# Altium footprint library GyokuRe.PcbLib: 1248 footprints (part 56 of 78) (continued)
## QFP208-28X28 [mm]
pads (210):
  oval 1.55x0.3 smd: 1(-14.899,12.751)
  rect 1.55x0.3 smd: 2(-14.899,12.251) 3(-14.899,11.751) 4(-14.899,11.251) 5(-14.899,10.751) 6(-14.899,10.251) 7(-14.899,9.751) 8(-14.899,9.251) 9(-14.899,8.751) 10(-14.899,8.251) 11(-14.899,7.751) 12(-14.899,7.251) 13(-14.899,6.751) 14(-14.899,6.251) 15(-14.899,5.751) 16(-14.899,5.251) 17(-14.899,4.751) 18(-14.899,4.251) 19(-14.899,3.751) 20(-14.899,3.251) 21(-14.899,2.751) 22(-14.899,2.251) 23(-14.899,1.751) 24(-14.899,1.251) 25(-14.899,0.751) 26(-14.899,0.251) 27(-14.899,-0.249) 28(-14.899,-0.749) 29(-14.899,-1.249) 30(-14.899,-1.749) 31(-14.899,-2.249) 32(-14.899,-2.749) 33(-14.899,-3.249) 34(-14.899,-3.749) 35(-14.899,-4.249) 36(-14.899,-4.749) 37(-14.899,-5.249) 38(-14.899,-5.749) 39(-14.899,-6.249) 40(-14.899,-6.749) 41(-14.899,-7.249) 42(-14.899,-7.749) 43(-14.899,-8.249) 44(-14.899,-8.749) 45(-14.899,-9.249) 46(-14.899,-9.749) 47(-14.899,-10.249) 48(-14.899,-10.749) 49(-14.899,-11.249) 50(-14.899,-11.749) 51(-14.899,-12.249) 52(-14.899,-12.749) 105(14.901,-12.749) 106(14.901,-12.249) 107(14.901,-11.749) 108(14.901,-11.249) 109(14.901,-10.749) 110(14.901,-10.249) 111(14.901,-9.749) 112(14.901,-9.249) 113(14.901,-8.749) 114(14.901,-8.249) 115(14.901,-7.749) 116(14.901,-7.249) 117(14.901,-6.749) 118(14.901,-6.249) 119(14.901,-5.749) 120(14.901,-5.249) 121(14.901,-4.749) 122(14.901,-4.249) 123(14.901,-3.749) 124(14.901,-3.249) 125(14.901,-2.749) 126(14.901,-2.249) 127(14.901,-1.749) 128(14.901,-1.249) 129(14.901,-0.749) 130(14.901,-0.249) 131(14.901,0.251) 132(14.901,0.751) 133(14.901,1.251) 134(14.901,1.751) 135(14.901,2.251) 136(14.901,2.751) 137(14.901,3.251) 138(14.901,3.751) 139(14.901,4.251) 140(14.901,4.751) 141(14.901,5.251) 142(14.901,5.751) 143(14.901,6.251) 144(14.901,6.751) 145(14.901,7.251) 146(14.901,7.751) 147(14.901,8.251) 148(14.901,8.751) 149(14.901,9.251) 150(14.901,9.751) 151(14.901,10.251) 152(14.901,10.751) 153(14.901,11.251) 154(14.901,11.751) 155(14.901,12.251) 156(14.901,12.751)
  rect 0.3x1.55 smd: 53(-12.749,-14.899) 54(-12.249,-14.899) 55(-11.749,-14.899) 56(-11.249,-14.899) 57(-10.749,-14.899) 58(-10.249,-14.899) 59(-9.749,-14.899) 60(-9.249,-14.899) 61(-8.749,-14.899) 62(-8.249,-14.899) 63(-7.749,-14.899) 64(-7.249,-14.899) 65(-6.749,-14.899) 66(-6.249,-14.899) 67(-5.749,-14.899) 68(-5.249,-14.899) 69(-4.749,-14.899) 70(-4.249,-14.899) 71(-3.749,-14.899) 72(-3.249,-14.899) 73(-2.749,-14.899) 74(-2.249,-14.899) 75(-1.749,-14.899) 76(-1.249,-14.899) 77(-0.749,-14.899) 78(-0.249,-14.899) 79(0.251,-14.899) 80(0.751,-14.899) 81(1.251,-14.899) 82(1.751,-14.899) 83(2.251,-14.899) 84(2.751,-14.899) 85(3.251,-14.899) 86(3.751,-14.899) 87(4.251,-14.899) 88(4.751,-14.899) 89(5.251,-14.899) 90(5.751,-14.899) 91(6.251,-14.899) 92(6.751,-14.899) 93(7.251,-14.899) 94(7.751,-14.899) 95(8.251,-14.899) 96(8.751,-14.899) 97(9.251,-14.899) 98(9.751,-14.899) 99(10.251,-14.899) 100(10.751,-14.899) 101(11.251,-14.899) 102(11.751,-14.899) 103(12.251,-14.899) 104(12.751,-14.899) 157(12.751,14.901) 158(12.251,14.901) 159(11.751,14.901) 160(11.251,14.901) 161(10.751,14.901) 162(10.251,14.901) 163(9.751,14.901) 164(9.251,14.901) 165(8.751,14.901) 166(8.251,14.901) 167(7.751,14.901) 168(7.251,14.901) 169(6.751,14.901) 170(6.251,14.901) 171(5.751,14.901) 172(5.251,14.901) 173(4.751,14.901) 174(4.251,14.901) 175(3.751,14.901) 176(3.251,14.901) 177(2.751,14.901) 178(2.251,14.901) 179(1.751,14.901) 180(1.251,14.901) 181(0.751,14.901) 182(0.251,14.901) 183(-0.249,14.901) 184(-0.749,14.901) 185(-1.249,14.901) 186(-1.749,14.901) 187(-2.249,14.901) 188(-2.749,14.901) 189(-3.249,14.901) 190(-3.749,14.901) 191(-4.249,14.901) 192(-4.749,14.901) 193(-5.249,14.901) 194(-5.749,14.901) 195(-6.249,14.901) 196(-6.749,14.901) 197(-7.249,14.901) 198(-7.749,14.901) 199(-8.249,14.901) 200(-8.749,14.901) 201(-9.249,14.901) 202(-9.749,14.901) 203(-10.249,14.901) 204(-10.749,14.901) 205(-11.249,14.901) 206(-11.749,14.901) 207(-12.249,14.901) 208(-12.749,14.901)
  round 1 smd: FID1(-14.899,-14.899) FID2(14.901,14.901)
Top Layer keep-out:
  circle w0.2: c14.901,14.901 r1.4
  circle w0.2: c-14.899,-14.899 r1.4
Top Overlay:
  circle w0.25: c-14.899,13.451 r0.125
  lines w0.2: -13.724,-13.724 13.726,-13.724 13.726,13.726 -13.724,13.726 -13.724,-13.724

## QFP240- 32X32 [mm] "240-Pin Plastic Quad Flat Pack (PQFP)"
height 4.1
pads (242):
  rect 1.5x0.3 smd: 1(-16.968,14.744)
  oval 1.5x0.3 smd: 2(-16.968,14.244) 3(-16.968,13.744) 4(-16.968,13.244) 5(-16.968,12.744) 6(-16.968,12.244) 7(-16.968,11.744) 8(-16.968,11.244) 9(-16.968,10.744) 10(-16.968,10.244) 11(-16.968,9.744) 12(-16.968,9.244) 13(-16.968,8.744) 14(-16.968,8.244) 15(-16.968,7.744) 16(-16.968,7.244) 17(-16.968,6.744) 18(-16.968,6.244) 19(-16.968,5.744) 20(-16.968,5.244) 21(-16.968,4.744) 22(-16.968,4.244) 23(-16.968,3.744) 24(-16.968,3.244) 25(-16.968,2.744) 26(-16.968,2.244) 27(-16.968,1.744) 28(-16.968,1.244) 29(-16.968,0.744) 30(-16.968,0.244) 31(-16.968,-0.256) 32(-16.968,-0.756) 33(-16.968,-1.256) 34(-16.968,-1.756) 35(-16.968,-2.256) 36(-16.968,-2.756) 37(-16.968,-3.256) 38(-16.968,-3.756) 39(-16.968,-4.256) 40(-16.968,-4.756) 41(-16.968,-5.256) 42(-16.968,-5.756) 43(-16.968,-6.256) 44(-16.968,-6.756) 45(-16.968,-7.256) 46(-16.968,-7.756) 47(-16.968,-8.256) 48(-16.968,-8.756) 49(-16.968,-9.256) 50(-16.968,-9.756) 51(-16.968,-10.256) 52(-16.968,-10.756) 53(-16.968,-11.256) 54(-16.968,-11.756) 55(-16.968,-12.256) 56(-16.968,-12.756) 57(-16.968,-13.256) 58(-16.968,-13.756) 59(-16.968,-14.256) 60(-16.968,-14.756) 121(16.982,-14.756) 122(16.982,-14.256) 123(16.982,-13.756) 124(16.982,-13.256) 125(16.982,-12.756) 126(16.982,-12.256) 127(16.982,-11.756) 128(16.982,-11.256) 129(16.982,-10.756) 130(16.982,-10.256) 131(16.982,-9.756) 132(16.982,-9.256) 133(16.982,-8.756) 134(16.982,-8.256) 135(16.982,-7.756) 136(16.982,-7.256) 137(16.982,-6.756) 138(16.982,-6.256) 139(16.982,-5.756) 140(16.982,-5.256) 141(16.982,-4.756) 142(16.982,-4.256) 143(16.982,-3.756) 144(16.982,-3.256) 145(16.982,-2.756) 146(16.982,-2.256) 147(16.982,-1.756) 148(16.982,-1.256) 149(16.982,-0.756) 150(16.982,-0.256) 151(16.982,0.244) 152(16.982,0.744) 153(16.982,1.244) 154(16.982,1.744) 155(16.982,2.244) 156(16.982,2.744) 157(16.982,3.244) 158(16.982,3.744) 159(16.982,4.244) 160(16.982,4.744) 161(16.982,5.244) 162(16.982,5.744) 163(16.982,6.244) 164(16.982,6.744) 165(16.982,7.244) 166(16.982,7.744) 167(16.982,8.244) 168(16.982,8.744) 169(16.982,9.244) 170(16.982,9.744) 171(16.982,10.244) 172(16.982,10.744) 173(16.982,11.244) 174(16.982,11.744) 175(16.982,12.244) 176(16.982,12.744) 177(16.982,13.244) 178(16.982,13.744) 179(16.982,14.244) 180(16.982,14.744)
  oval 0.3x1.5 smd: 61(-14.743,-16.981) 62(-14.243,-16.981) 63(-13.743,-16.981) 64(-13.243,-16.981) 65(-12.743,-16.981) 66(-12.243,-16.981) 67(-11.743,-16.981) 68(-11.243,-16.981) 69(-10.743,-16.981) 70(-10.243,-16.981) 71(-9.743,-16.981) 72(-9.243,-16.981) 73(-8.743,-16.981) 74(-8.243,-16.981) 75(-7.743,-16.981) 76(-7.243,-16.981) 77(-6.743,-16.981) 78(-6.243,-16.981) 79(-5.743,-16.981) 80(-5.243,-16.981) 81(-4.743,-16.981) 82(-4.243,-16.981) 83(-3.743,-16.981) 84(-3.243,-16.981) 85(-2.743,-16.981) 86(-2.243,-16.981) 87(-1.743,-16.981) 88(-1.243,-16.981) 89(-0.743,-16.981) 90(-0.243,-16.981) 91(0.257,-16.981) 92(0.757,-16.981) 93(1.257,-16.981) 94(1.757,-16.981) 95(2.257,-16.981) 96(2.757,-16.981) 97(3.257,-16.981) 98(3.757,-16.981) 99(4.257,-16.981) 100(4.757,-16.981) 101(5.257,-16.981) 102(5.757,-16.981) 103(6.257,-16.981) 104(6.757,-16.981) 105(7.257,-16.981) 106(7.757,-16.981) 107(8.257,-16.981) 108(8.757,-16.981) 109(9.257,-16.981) 110(9.757,-16.981) 111(10.257,-16.981) 112(10.757,-16.981) 113(11.257,-16.981) 114(11.757,-16.981) 115(12.257,-16.981) 116(12.757,-16.981) 117(13.257,-16.981) 118(13.757,-16.981) 119(14.257,-16.981) 120(14.757,-16.981) 181(14.757,16.969) 182(14.257,16.969) 183(13.757,16.969) 184(13.257,16.969) 185(12.757,16.969) 186(12.257,16.969) 187(11.757,16.969) 188(11.257,16.969) 189(10.757,16.969) 190(10.257,16.969) 191(9.757,16.969) 192(9.257,16.969) 193(8.757,16.969) 194(8.257,16.969) 195(7.757,16.969) 196(7.257,16.969) 197(6.757,16.969) 198(6.257,16.969) 199(5.757,16.969) 200(5.257,16.969) 201(4.757,16.969) 202(4.257,16.969) 203(3.757,16.969) 204(3.257,16.969) 205(2.757,16.969) 206(2.257,16.969) 207(1.757,16.969) 208(1.257,16.969) 209(0.757,16.969) 210(0.257,16.969) 211(-0.243,16.969) 212(-0.743,16.969) 213(-1.243,16.969) 214(-1.743,16.969) 215(-2.243,16.969) 216(-2.743,16.969) 217(-3.243,16.969) 218(-3.743,16.969) 219(-4.243,16.969) 220(-4.743,16.969) 221(-5.243,16.969) 222(-5.743,16.969) 223(-6.243,16.969) 224(-6.743,16.969) 225(-7.243,16.969) 226(-7.743,16.969) 227(-8.243,16.969) 228(-8.743,16.969) 229(-9.243,16.969) 230(-9.743,16.969) 231(-10.243,16.969) 232(-10.743,16.969) 233(-11.243,16.969) 234(-11.743,16.969) 235(-12.243,16.969) 236(-12.743,16.969) 237(-13.243,16.969) 238(-13.743,16.969) 239(-14.243,16.969) 240(-14.743,16.969)
  round 1 smd: FID1(-16.968,16.969) FID2(16.982,-16.981)
Top Layer:
  circle w0.25: c-17.944,15.342 r0.125
Top Layer keep-out:
  circle w0.2: c16.982,-16.981 r1.4
  circle w0.2: c-16.968,16.969 r1.4
Top Overlay:
  circle w0.25: c-16.968,15.444 r0.125
  lines w0.2: -15.818,-15.831 -15.818,15.819 15.832,15.819 15.832,-15.831 -15.818,-15.831

## QFP-24x24-0.5-176 [mm] "176-Pin Plastic Quad Flat Pack, Body 24mmx24mm, Pitch 0.5 m"
height 1.6
pads (176):
  rect 1.6x0.3 smd: 1(-12.6,10.75) 2(-12.6,10.25) 3(-12.6,9.75) 4(-12.6,9.25) 5(-12.6,8.75) 6(-12.6,8.25) 7(-12.6,7.75) 8(-12.6,7.25) 9(-12.6,6.75) 10(-12.6,6.25) 11(-12.6,5.75) 12(-12.6,5.25) 13(-12.6,4.75) 14(-12.6,4.25) 15(-12.6,3.75) 16(-12.6,3.25) 17(-12.6,2.75) 18(-12.6,2.25) 19(-12.6,1.75) 20(-12.6,1.25) 21(-12.6,0.75) 22(-12.6,0.25) 23(-12.6,-0.25) 24(-12.6,-0.75) 25(-12.6,-1.25) 26(-12.6,-1.75) 27(-12.6,-2.25) 28(-12.6,-2.75) 29(-12.6,-3.25) 30(-12.6,-3.75) 31(-12.6,-4.25) 32(-12.6,-4.75) 33(-12.6,-5.25) 34(-12.6,-5.75) 35(-12.6,-6.25) 36(-12.6,-6.75) 37(-12.6,-7.25) 38(-12.6,-7.75) 39(-12.6,-8.25) 40(-12.6,-8.75) 41(-12.6,-9.25) 42(-12.6,-9.75) 43(-12.6,-10.25) 44(-12.6,-10.75) 89(12.6,-10.75) 90(12.6,-10.25) 91(12.6,-9.75) 92(12.6,-9.25) 93(12.6,-8.75) 94(12.6,-8.25) 95(12.6,-7.75) 96(12.6,-7.25) 97(12.6,-6.75) 98(12.6,-6.25) 99(12.6,-5.75) 100(12.6,-5.25) 101(12.6,-4.75) 102(12.6,-4.25) 103(12.6,-3.75) 104(12.6,-3.25) 105(12.6,-2.75) 106(12.6,-2.25) 107(12.6,-1.75) 108(12.6,-1.25) 109(12.6,-0.75) 110(12.6,-0.25) 111(12.6,0.25) 112(12.6,0.75) 113(12.6,1.25) 114(12.6,1.75) 115(12.6,2.25) 116(12.6,2.75) 117(12.6,3.25) 118(12.6,3.75) 119(12.6,4.25) 120(12.6,4.75) 121(12.6,5.25) 122(12.6,5.75) 123(12.6,6.25) 124(12.6,6.75) 125(12.6,7.25) 126(12.6,7.75) 127(12.6,8.25) 128(12.6,8.75) 129(12.6,9.25) 130(12.6,9.75) 131(12.6,10.25) 132(12.6,10.75)
  rect 0.3x1.6 smd: 45(-10.75,-12.6) 46(-10.25,-12.6) 47(-9.75,-12.6) 48(-9.25,-12.6) 49(-8.75,-12.6) 50(-8.25,-12.6) 51(-7.75,-12.6) 52(-7.25,-12.6) 53(-6.75,-12.6) 54(-6.25,-12.6) 55(-5.75,-12.6) 56(-5.25,-12.6) 57(-4.75,-12.6) 58(-4.25,-12.6) 59(-3.75,-12.6) 60(-3.25,-12.6) 61(-2.75,-12.6) 62(-2.25,-12.6) 63(-1.75,-12.6) 64(-1.25,-12.6) 65(-0.75,-12.6) 66(-0.25,-12.6) 67(0.25,-12.6) 68(0.75,-12.6) 69(1.25,-12.6) 70(1.75,-12.6) 71(2.25,-12.6) 72(2.75,-12.6) 73(3.25,-12.6) 74(3.75,-12.6) 75(4.25,-12.6) 76(4.75,-12.6) 77(5.25,-12.6) 78(5.75,-12.6) 79(6.25,-12.6) 80(6.75,-12.6) 81(7.25,-12.6) 82(7.75,-12.6) 83(8.25,-12.6) 84(8.75,-12.6) 85(9.25,-12.6) 86(9.75,-12.6) 87(10.25,-12.6) 88(10.75,-12.6) 133(10.75,12.6) 134(10.25,12.6) 135(9.75,12.6) 136(9.25,12.6) 137(8.75,12.6) 138(8.25,12.6) 139(7.75,12.6) 140(7.25,12.6) 141(6.75,12.6) 142(6.25,12.6) 143(5.75,12.6) 144(5.25,12.6) 145(4.75,12.6) 146(4.25,12.6) 147(3.75,12.6) 148(3.25,12.6) 149(2.75,12.6) 150(2.25,12.6) 151(1.75,12.6) 152(1.25,12.6) 153(0.75,12.6) 154(0.25,12.6) 155(-0.25,12.6) 156(-0.75,12.6) 157(-1.25,12.6) 158(-1.75,12.6) 159(-2.25,12.6) 160(-2.75,12.6) 161(-3.25,12.6) 162(-3.75,12.6) 163(-4.25,12.6) 164(-4.75,12.6) 165(-5.25,12.6) 166(-5.75,12.6) 167(-6.25,12.6) 168(-6.75,12.6) 169(-7.25,12.6) 170(-7.75,12.6) 171(-8.25,12.6) 172(-8.75,12.6) 173(-9.25,12.6) 174(-9.75,12.6) 175(-10.25,12.6) 176(-10.75,12.6)
Top Overlay:
  circle w0.25: c-12.6,11.45 r0.125
  lines w0.2: -11.4,-11.4 -11.4,11.4 11.4,11.4 11.4,-11.4 -11.4,-11.4
3D body "QPF-26x26-0.5-176.step": height 1.35, standoff 0, extent -13.014,-13.014 13.014,13.014

## QFP-24x24-0.5-176-A [mil] "176-Pin Plastic Quad Flat Pack, Body 24mmx24mm, Pitch 0.5 m; Adaptor"
height 787.4
pads (176):
  rect 64x64 hole 40: 1(-1235,1050) 45(-1050,-1235) 89(1235,-1050) 133(1050,1235)
  round 64 hole 40: 2(-1335,1050) 3(-1235,950) 4(-1335,950) 5(-1235,850) 6(-1335,850) 7(-1235,750) 8(-1335,750) 9(-1235,650) 10(-1335,650) 11(-1235,550) 12(-1335,550) 13(-1235,450) 14(-1335,450) 15(-1235,350) 16(-1335,350) 17(-1235,250) 18(-1335,250) 19(-1235,150) 20(-1335,150) 21(-1235,50) 22(-1335,50) 23(-1235,-50) 24(-1335,-50) 25(-1235,-150) 26(-1335,-150) 27(-1235,-250) 28(-1335,-250) 29(-1235,-350) 30(-1335,-350) 31(-1235,-450) 32(-1335,-450) 33(-1235,-550) 34(-1335,-550) 35(-1235,-650) 36(-1335,-650) 37(-1235,-750) 38(-1335,-750) 39(-1235,-850) 40(-1335,-850) 41(-1235,-950) 42(-1335,-950) 43(-1235,-1050) 44(-1335,-1050) 46(-1050,-1335) 47(-950,-1235) 48(-950,-1335) 49(-850,-1235) 50(-850,-1335) 51(-750,-1235) 52(-750,-1335) 53(-650,-1235) 54(-650,-1335) 55(-550,-1235) 56(-550,-1335) 57(-450,-1235) 58(-450,-1335) 59(-350,-1235) 60(-350,-1335) 61(-250,-1235) 62(-250,-1335) 63(-150,-1235) 64(-150,-1335) 65(-50,-1235) 66(-50,-1335) 67(50,-1235) 68(50,-1335) 69(150,-1235) 70(150,-1335) 71(250,-1235) 72(250,-1335) 73(350,-1235) 74(350,-1335) 75(450,-1235) 76(450,-1335) 77(550,-1235) 78(550,-1335) 79(650,-1235) 80(650,-1335) 81(750,-1235) 82(750,-1335) 83(850,-1235) 84(850,-1335) 85(950,-1235) 86(950,-1335) 87(1050,-1235) 88(1050,-1335) 90(1335,-1050) 91(1235,-950) 92(1335,-950) 93(1235,-850) 94(1335,-850) 95(1235,-750) 96(1335,-750) 97(1235,-650) 98(1335,-650) 99(1235,-550) 100(1335,-550) 101(1235,-450) 102(1335,-450) 103(1235,-350) 104(1335,-350) 105(1235,-250) 106(1335,-250) 107(1235,-150) 108(1335,-150) 109(1235,-50) 110(1335,-50) 111(1235,50) 112(1335,50) 113(1235,150) 114(1335,150) 115(1235,250) 116(1335,250) 117(1235,350) 118(1335,350) 119(1235,450) 120(1335,450) 121(1235,550) 122(1335,550) 123(1235,650) 124(1335,650) 125(1235,750) 126(1335,750) 127(1235,850) 128(1335,850) 129(1235,950) 130(1335,950) 131(1235,1050) 132(1335,1050) 134(1050,1335) 135(950,1235) 136(950,1335) 137(850,1235) 138(850,1335) 139(750,1235) 140(750,1335) 141(650,1235) 142(650,1335) 143(550,1235) 144(550,1335) 145(450,1235) 146(450,1335) 147(350,1235) 148(350,1335) 149(250,1235) 150(250,1335) 151(150,1235) 152(150,1335) 153(50,1235) 154(50,1335) 155(-50,1235) 156(-50,1335) 157(-150,1235) 158(-150,1335) 159(-250,1235) 160(-250,1335) 161(-350,1235) 162(-350,1335) 163(-450,1235) 164(-450,1335) 165(-550,1235) 166(-550,1335) 167(-650,1235) 168(-650,1335) 169(-750,1235) 170(-750,1335) 171(-850,1235) 172(-850,1335) 173(-950,1235) 174(-950,1335) 175(-1050,1235) 176(-1050,1335)
Top Overlay:
  circle w10: c-1235,1150 r11.18
  circle w10: c-1235,1150 r5
  lines w10: -1395,-1110 -1175,-1110 -1175,1110 -1395,1110 -1395,-1110 ; -1110,-1395 1110,-1395 1110,-1175 -1110,-1175 -1110,-1395 ; -1110,1175 1110,1175 1110,1395 -1110,1395 -1110,1175 ; 1175,-1110 1175,1110 1395,1110 1395,-1110 1175,-1110
3D body "Samtec-SSW-122-01-G-D.step": height 336, standoff -103, extent -1382.5,-1110 -1187.5,1110
3D body "Samtec-SSW-122-01-G-D.step": height 336, standoff -103, extent 1187.5,-1110 1382.5,1110
3D body "Samtec-SSW-122-01-G-D.step": height 336, standoff -103, extent -1110,1187.5 1110,1382.5
3D body "Samtec-SSW-122-01-G-D.step": height 336, standoff -103, extent -1110,-1382.5 1110,-1187.5

## QFP-44_M [mm] "Thin QFP, 44-Leads, Body 10x10mm, Pitch 0.8mm, IPC Low Density"
height 1.2
pads (44):
  oval 2.05x0.6 smd: 1(0,0) 2(0,-0.8) 3(0,-1.6) 4(0,-2.4) 5(0,-3.2) 6(0,-4) 7(0,-4.8) 8(0,-5.6) 9(0,-6.4) 10(0,-7.2) 11(0,-8) 23(11.4,-8) 24(11.4,-7.2) 25(11.4,-6.4) 26(11.4,-5.6) 27(11.4,-4.8) 28(11.4,-4) 29(11.4,-3.2) 30(11.4,-2.4) 31(11.4,-1.6) 32(11.4,-0.8) 33(11.4,0)
  oval 0.6x2.05 smd: 12(1.7,-9.7) 13(2.5,-9.7) 14(3.3,-9.7) 15(4.1,-9.7) 16(4.9,-9.7) 17(5.7,-9.7) 18(6.5,-9.7) 19(7.3,-9.7) 20(8.1,-9.7) 21(8.9,-9.7) 22(9.7,-9.7) 34(9.7,1.7) 35(8.9,1.7) 36(8.1,1.7) 37(7.3,1.7) 38(6.5,1.7) 39(5.7,1.7) 40(4.9,1.7) 41(4.1,1.7) 42(3.3,1.7) 43(2.5,1.7) 44(1.7,1.7)
Top Overlay:
  circle w0.5: c-0.75,1.275 r0.25
  circle w0.6: c2.45,-0.75 r0.3
  lines w0.2: 1.45,-8.25 1.45,0.25 9.95,0.25 9.95,-8.25 1.45,-8.25
  text "44" at 1.725,3.45 h0.61
  text "34" at 10.525,3.55 h0.61
  text "11" at -2.675,-8.55 h0.61
  text "1" at -2.175,0.05 h0.61
  text "22" at 10.425,-12.35 h0.61
  text "12" at 1.725,-12.35 h0.61
  text "33" at 13.225,0.05 h0.61
  text "23" at 13.325,-8.55 h0.61
Mechanical 13:
  circle w0.1: c1.6,0.1 r0.5
  lines w0.1: 0.7,-9 0.7,1 10.7,1 10.7,-9 0.7,-9
Mechanical 15:
  lines w0.1: 5.2,-4 6.2,-4 ; 5.7,-4.5 5.7,-3.5 ; -1.5,-11.2 -1.5,3.2 12.9,3.2 12.9,-11.2 -1.5,-11.2
3D body: height 0.25, standoff 0.01, extent -0.326,-0.225 0.725,0.226
3D body: height 0.25, standoff 0.01, extent -0.326,-1.025 0.725,-0.574
3D body: height 0.25, standoff 0.01, extent -0.326,-2.625 0.725,-2.174
3D body: height 0.25, standoff 0.01, extent -0.326,-1.825 0.725,-1.374
3D body: height 0.25, standoff 0.01, extent -0.326,-4.225 0.725,-3.774
3D body: height 0.25, standoff 0.01, extent -0.326,-3.425 0.725,-2.974
3D body: height 0.25, standoff 0.01, extent -0.326,-5.825 0.725,-5.374
3D body: height 0.25, standoff 0.01, extent -0.326,-5.025 0.725,-4.574
3D body: height 0.25, standoff 0.01, extent -0.326,-7.425 0.725,-6.974
3D body: height 0.25, standoff 0.01, extent -0.326,-6.625 0.725,-6.174
3D body: height 0.25, standoff 0.01, extent -0.326,-8.225 0.725,-7.774
3D body: height 0.25, standoff 0.01, extent 10.7,-0.226 11.751,0.225
3D body: height 0.25, standoff 0.01, extent 10.7,-1.826 11.751,-1.375
3D body: height 0.25, standoff 0.01, extent 10.7,-1.026 11.751,-0.575
3D body: height 0.25, standoff 0.01, extent 10.7,-3.426 11.751,-2.975
3D body: height 0.25, standoff 0.01, extent 10.7,-2.626 11.751,-2.175
3D body: height 0.25, standoff 0.01, extent 10.7,-5.026 11.751,-4.575
3D body: height 0.25, standoff 0.01, extent 10.7,-4.226 11.751,-3.775
3D body: height 0.25, standoff 0.01, extent 10.7,-6.626 11.751,-6.175
3D body: height 0.25, standoff 0.01, extent 10.7,-5.826 11.751,-5.375
3D body: height 0.25, standoff 0.01, extent 10.7,-7.426 11.751,-6.975
3D body: height 0.25, standoff 0.01, extent 10.7,-8.226 11.751,-7.775
3D body: height 0.25, standoff 0.01, extent 9.474,-10.051 9.925,-9
3D body: height 0.25, standoff 0.01, extent 7.874,-10.051 8.325,-9
3D body: height 0.25, standoff 0.01, extent 8.674,-10.051 9.125,-9
3D body: height 0.25, standoff 0.01, extent 6.274,-10.051 6.725,-9
3D body: height 0.25, standoff 0.01, extent 7.074,-10.051 7.525,-9
3D body: height 0.25, standoff 0.01, extent 4.674,-10.051 5.125,-9
3D body: height 0.25, standoff 0.01, extent 5.474,-10.051 5.925,-9
3D body: height 0.25, standoff 0.01, extent 3.074,-10.051 3.525,-9
3D body: height 0.25, standoff 0.01, extent 3.874,-10.051 4.325,-9
3D body: height 0.25, standoff 0.01, extent 2.274,-10.051 2.725,-9
3D body: height 0.25, standoff 0.01, extent 1.474,-10.051 1.925,-9
3D body: height 0.25, standoff 0.01, extent 1.475,1 1.926,2.051
3D body: height 0.25, standoff 0.01, extent 3.075,1 3.526,2.051
3D body: height 0.25, standoff 0.01, extent 2.275,1 2.726,2.051
3D body: height 0.25, standoff 0.01, extent 4.675,1 5.126,2.051
3D body: height 0.25, standoff 0.01, extent 3.875,1 4.326,2.051
3D body: height 0.25, standoff 0.01, extent 6.275,1 6.726,2.051
3D body: height 0.25, standoff 0.01, extent 5.475,1 5.926,2.051
3D body: height 0.25, standoff 0.01, extent 7.875,1 8.326,2.051
3D body: height 0.25, standoff 0.01, extent 7.075,1 7.526,2.051
3D body: height 0.25, standoff 0.01, extent 8.675,1 9.126,2.051
3D body: height 0.25, standoff 0.01, extent 9.475,1 9.926,2.051
3D body: height 1.2, standoff 0.15, extent 0.7,-9 10.7,1

## QFP-44_N [mm] "QFP, 44-Leads, Body 10x10 mm, Pitch 0.8mm"
height 1
pads (44):
  oval 1.5x0.45 smd: 1(0,0) 2(0,-0.8) 3(0,-1.6) 4(0,-2.4) 5(0,-3.2) 6(0,-4) 7(0,-4.8) 8(0,-5.6) 9(0,-6.4) 10(0,-7.2) 11(0,-8) 23(11.4,-8) 24(11.4,-7.2) 25(11.4,-6.4) 26(11.4,-5.6) 27(11.4,-4.8) 28(11.4,-4) 29(11.4,-3.2) 30(11.4,-2.4) 31(11.4,-1.6) 32(11.4,-0.8) 33(11.4,0)
  oval 0.45x1.5 smd: 12(1.7,-9.7) 14(3.3,-9.75) 15(4.1,-9.75) 16(4.9,-9.75) 17(5.7,-9.75) 18(6.5,-9.75) 19(7.3,-9.75) 20(8.1,-9.75) 21(8.9,-9.75) 22(9.7,-9.75) 34(9.7,1.7) 35(8.9,1.7) 36(8.1,1.7) 37(7.3,1.7) 38(6.5,1.7) 39(5.7,1.7) 40(4.9,1.7) 41(4.1,1.7) 42(3.3,1.7) 43(2.5,1.7) 44(1.7,1.7)
  oval 0.45x1.5 smd mask+0.102: 13(2.5,-9.75)
Top Overlay:
  circle w0.25: c-1.5,0.775 r0.125
  circle w0.1: c1.65,0.125 r0.5
  lines w0.1: 12.275,2.625 -0.925,2.625 -0.925,-10.6 12.3,-10.6 12.3,2.625
  lines w0.2: 0.625,0.7 0.625,1 0.925,1 ; 0.675,-8.775 0.675,-9.075 0.975,-9.075 ; 10.45,1.05 10.75,1.05 10.75,0.75 ; 10.55,-9.075 10.85,-9.075 10.85,-8.775
3D body "TQFP-44.STEP": height 1.5, standoff 0.44, extent -0.325,-10 11.675,2

## QFP-44N [mm] "Thin QFP, 44-Leads, Body 10x10mm, Pitch 0.8mm, IPC Low Density"
height 1.2
pads (44):
  oval 2.05x0.6 smd: 1(0,0) 2(0,-0.8) 3(0,-1.6) 4(0,-2.4) 5(0,-3.2) 6(0,-4) 7(0,-4.8) 8(0,-5.6) 9(0,-6.4) 10(0,-7.2) 11(0,-8) 23(11.4,-8) 24(11.4,-7.2) 25(11.4,-6.4) 26(11.4,-5.6) 27(11.4,-4.8) 28(11.4,-4) 29(11.4,-3.2) 30(11.4,-2.4) 31(11.4,-1.6) 32(11.4,-0.8) 33(11.4,0)
  oval 0.6x2.05 smd: 12(1.7,-9.7) 13(2.5,-9.7) 14(3.3,-9.7) 15(4.1,-9.7) 16(4.9,-9.7) 17(5.7,-9.7) 18(6.5,-9.7) 19(7.3,-9.7) 20(8.1,-9.7) 21(8.9,-9.7) 22(9.7,-9.7) 34(9.7,1.7) 35(8.9,1.7) 36(8.1,1.7) 37(7.3,1.7) 38(6.5,1.7) 39(5.7,1.7) 40(4.9,1.7) 41(4.1,1.7) 42(3.3,1.7) 43(2.5,1.7) 44(1.7,1.7)
Top Overlay:
  circle w0.6: c2.45,-0.75 r0.3
  circle w0.5: c-0.75,1.275 r0.25
  lines w0.2: 1.45,-8.25 9.95,-8.25 9.95,0.25 1.45,0.25 1.45,-8.25
  text "23" at 13.325,-8.55 h0.61
  text "33" at 13.225,0.05 h0.61
  text "12" at 1.725,-12.35 h0.61
  text "22" at 10.425,-12.35 h0.61
  text "1" at -2.175,0.05 h0.61
  text "11" at -2.675,-8.55 h0.61
  text "34" at 10.525,3.55 h0.61
  text "44" at 1.725,3.45 h0.61
Mechanical 13:
  circle w0.1: c1.6,0.1 r0.5
  lines w0.1: 0.7,-9 10.7,-9 10.7,1 0.7,1 0.7,-9
Mechanical 15:
  lines w0.1: 5.2,-4 6.2,-4 ; 5.7,-4.5 5.7,-3.5 ; -1.5,-11.2 12.9,-11.2 12.9,3.2 -1.5,3.2 -1.5,-11.2
3D body "TQFP-44.STEP": height 1.1, standoff 0.04, extent -0.3,-10 11.7,2

## QSMO_4200 [mm] "Ociloscope Generator"
pads (4):
  rect 2x1.8 smd: 1(-0.009,0.39) 2(5.071,0.39) 3(5.071,4.59) 4(-0.009,4.59)
Top Overlay:
  circle w0.25: c-1.784,0.69 r0.125
  lines w0.2: -1.203,1.54 -1.203,3.419 ; 1.152,4.943 3.902,4.943 ; 1.159,0.092 3.877,0.092 ; 6.214,1.479 6.214,3.419
Mechanical 15:
  lines w0.1: -1.152,0.092 -1.152,1.184 ; -1.129,0.08 -0.279,0.08 -0.299,0.1 ; -1.129,3.89 -1.129,4.97 -0.269,4.97 ; -1.127,1.692 -1.127,2.276 ; -1.127,2.784 -1.127,3.369 ; -1.109,1.19 ccw(c-1.109,1.44) -1.109,1.69 ; -1.109,3.39 ccw(c-1.109,3.64) -1.109,3.89 ; -1.099,2.27 ccw(c-1.099,2.52) -1.099,2.77 ; -0.839,0.48 5.861,0.48 5.861,4.62 -0.829,4.62 -0.829,3.9 -0.829,0.5 ; -0.309,0.14 cw(c-0.059,0.14) 0.191,0.14 ; -0.239,4.9 ccw(c0.011,4.9) 0.261,4.9 ; 0.181,0.09 4.771,0.09 ; 0.241,4.94 4.861,4.94 ; 4.791,0.15 cw(c5.041,0.15) 5.291,0.15 ; 4.871,4.9 ccw(c5.121,4.9) 5.371,4.9 ; 5.281,0.11 6.221,0.11 6.221,1.09 ; 5.341,4.93 6.211,4.93 6.211,3.9 ; 6.188,1.61 6.188,2.175 ; 6.191,1.09 cw(c6.191,1.34) 6.191,1.59 ; 6.191,2.19 cw(c6.191,2.44) 6.191,2.69 ; 6.191,3.39 cw(c6.191,3.64) 6.191,3.89 ; 6.214,2.694 6.214,3.369
3D body: height 0.75, standoff 0, extent 4.28,-0.2 5.88,1.1
3D body: height 0.75, standoff 0, extent -0.818,-0.319 0.782,0.981
3D body: height 0.75, standoff 0, extent 4.28,4 5.88,5.3
3D body: height 0.75, standoff 0, extent -0.8,4 0.8,5.3
3D body: height 1.5, standoff 0, extent -1.143,0.127 6.096,4.953

## QTO247 + heatsick [mil]
pads (5):
  round 137.8 hole 78.74: 0(-136.34,194) 0(563.66,194)
  rect 110x180 hole 59.06: 1(3,1)
  oval 110x180 hole 59.06: 2(213.66,4) 3(422.32,4)
Top Overlay:
  region: 595,290 595,265 615,245 620,245 630,235 630,225 635,220 635,160 660,160 665,165 650,180 650,290
  region: 475,290 525,290 525,255 520,255 500,235 500,225 490,215 490,180 495,175 495,160 475,160
  region: -225,290 -175,290 -175,255 -180,255 -200,235 -200,225 -210,215 -210,180 -205,175 -205,160 -225,160
  region: -105,290 -105,265 -85,245 -80,245 -70,235 -70,225 -65,220 -65,160 -40,160 -35,165 -50,180 -50,290
  region: 140,290 190,290 190,240 170,220 170,180 190,160 140,160
  region: 230,290 290,290 290,150 280,160 230,160 250,180 250,220 230,240
  lines w10: -225,290 -175,290 -175,260 ; -173.69,257.87 ccw(c-135,195) -105.92,262.86 ; -163.31,220 ccw(c-134.15,190.85) -105,220 ; -105,265 -105,290 -55,290 ; 130,290 185,290 185,235 180,230 ; 181.96,229.73 ccw(c210.85,200.85) 239.73,229.73 ; 240,230 235,235 235,290 280,290 ; 475,290 525,290 525,260 ; 526.31,257.87 ccw(c565,195) 594.08,262.86 ; 595,265 595,290 645,290
  lines w35: -236.34,-156 -236.34,444 ; -42,149 -42,445 ; 129,149 129,445 ; 297,148 297,450 ; 471,148 471,448 ; 663.66,-156 663.66,444
  lines w40: -230,145 655,145
Mechanical 1:
  lines w10: -93.43,76.83 520.75,76.83 ; -93.43,-41.28 -93.43,135.89 520.75,135.89 520.75,-41.28 -93.43,-41.28
3D body "User Library-heat sink-1.STEP": height 1206.11, standoff 0.6, extent -252.79,-166.67 648.79,479
3D body "SW3dPS-TO-247.STEP": height 940.6, standoff -479.4, extent -92,-73 508,107

## QTO247+LageHeatsink [mil]
pads (3):
  rect 100x150 hole 50: 1(0,-1)
  oval 100x150 hole 50: 2(200,1) 3(400,0)
Top Overlay:
  lines w10: -102,-121 -101,-120 -101,102 501,102 500,-122 -101,-122 -100,-121 ; -100,-82 -80.43,-82 cw(c-80.43,-184.43) -8,-112 ; 208,119 526,119 524,-113 1082,-364 ; 214,118 -115,118 -113,-122 -566,-361 -398,-108 -575,-3 -391,106 -568,298 -403,303 -568,592 -111,170 520,172 1078,590 ; 415,-119 ccw(c415,-116.59) 416.71,-118.29 434,-101 cw(c479.87,-146.87) 479.87,-82 499,-82 ; 1084,-367 916,-114 1093,-9 909,100 1086,292 921,297 1086,586
3D body "SW3dPS-aavid 6298b.STEP": height 1100, standoff 100, extent -619,-329 1031,633
3D body "SW3dPS-to-247ad.STEP": height 1006.77, standoff -610.16, extent -108.98,-107 518.98,91.03

## QTO-92 [mil] "TO-92"
height 200
pads (3):
  oval 66x100 hole 32: 1(-100,0) 2(0,0) 3(100,0)
Top Overlay:
  lines w7: -116.52,43.21 cw(c0.97,-12.43) 119.94,39.97 ; -115.34,-40.24 -98,-65 105,-65 118,-39
3D body "SW3dPS-TO92.STEP": height 245.04, standoff -199.79, extent -108.87,-65.56 108.86,95

## QTO-92A [mil] "TO-92"
height 200
pads (3):
  oval 66x100 hole 32: 1(100,0) 2(0,0) 3(-100,0)
Top Overlay:
  lines w7: -116.52,43.21 cw(c0.97,-12.43) 119.08,41.88 ; -115.34,-40.24 -98,-65 105,-65 118,-39
3D body "SW3dPS-TO92.STEP": height 245.04, standoff -199.79, extent -110,-60.56 107.73,100

## QTO-92B [mil] "TO-92"
height 200
pads (3):
  oval 70x100 hole 32: 1(-100,0) 2(0,100) 3(100,0)
Top Overlay:
  lines w7: -116.52,43.21 cw(c0.97,-12.43) -38.82,111.34 ; -115.34,-40.24 -98,-65 105,-65 118,-39 ; 36.81,113.84 cw(c2.42,-11.53) 121.49,40.65

## QTO-92B1 [mil] "TO-92"
height 200
pads (3):
  oval 75x100 hole 32: 1(-115,0) 2(0,0) 3(120,0)
Top Overlay:
  lines w7: -116.52,43.21 cw(c0.97,-12.43) -38.82,111.34 ; -115.34,-40.24 -98,-65 105,-65 118,-39 ; -40.42,111.21 cw(c2.42,-11.53) 121.49,40.65
3D body "SW3dPS-TO92.STEP": height 245.04, standoff -199.79, extent -112.74,-65.56 105,95